# Altium footprint library 14-Inductors.PcbLib: 164 footprints (part 10 of 11)
Each footprint in its own frame and in the unit in brackets; x right, y up, seen from the top. Pads: shape width x height; smd on the part's side, far side on the other; paste and mask are expansions set on the pad; w line width, h text height; cw(c..) or ccw(c..) is an arc to the next point about the centre after c.
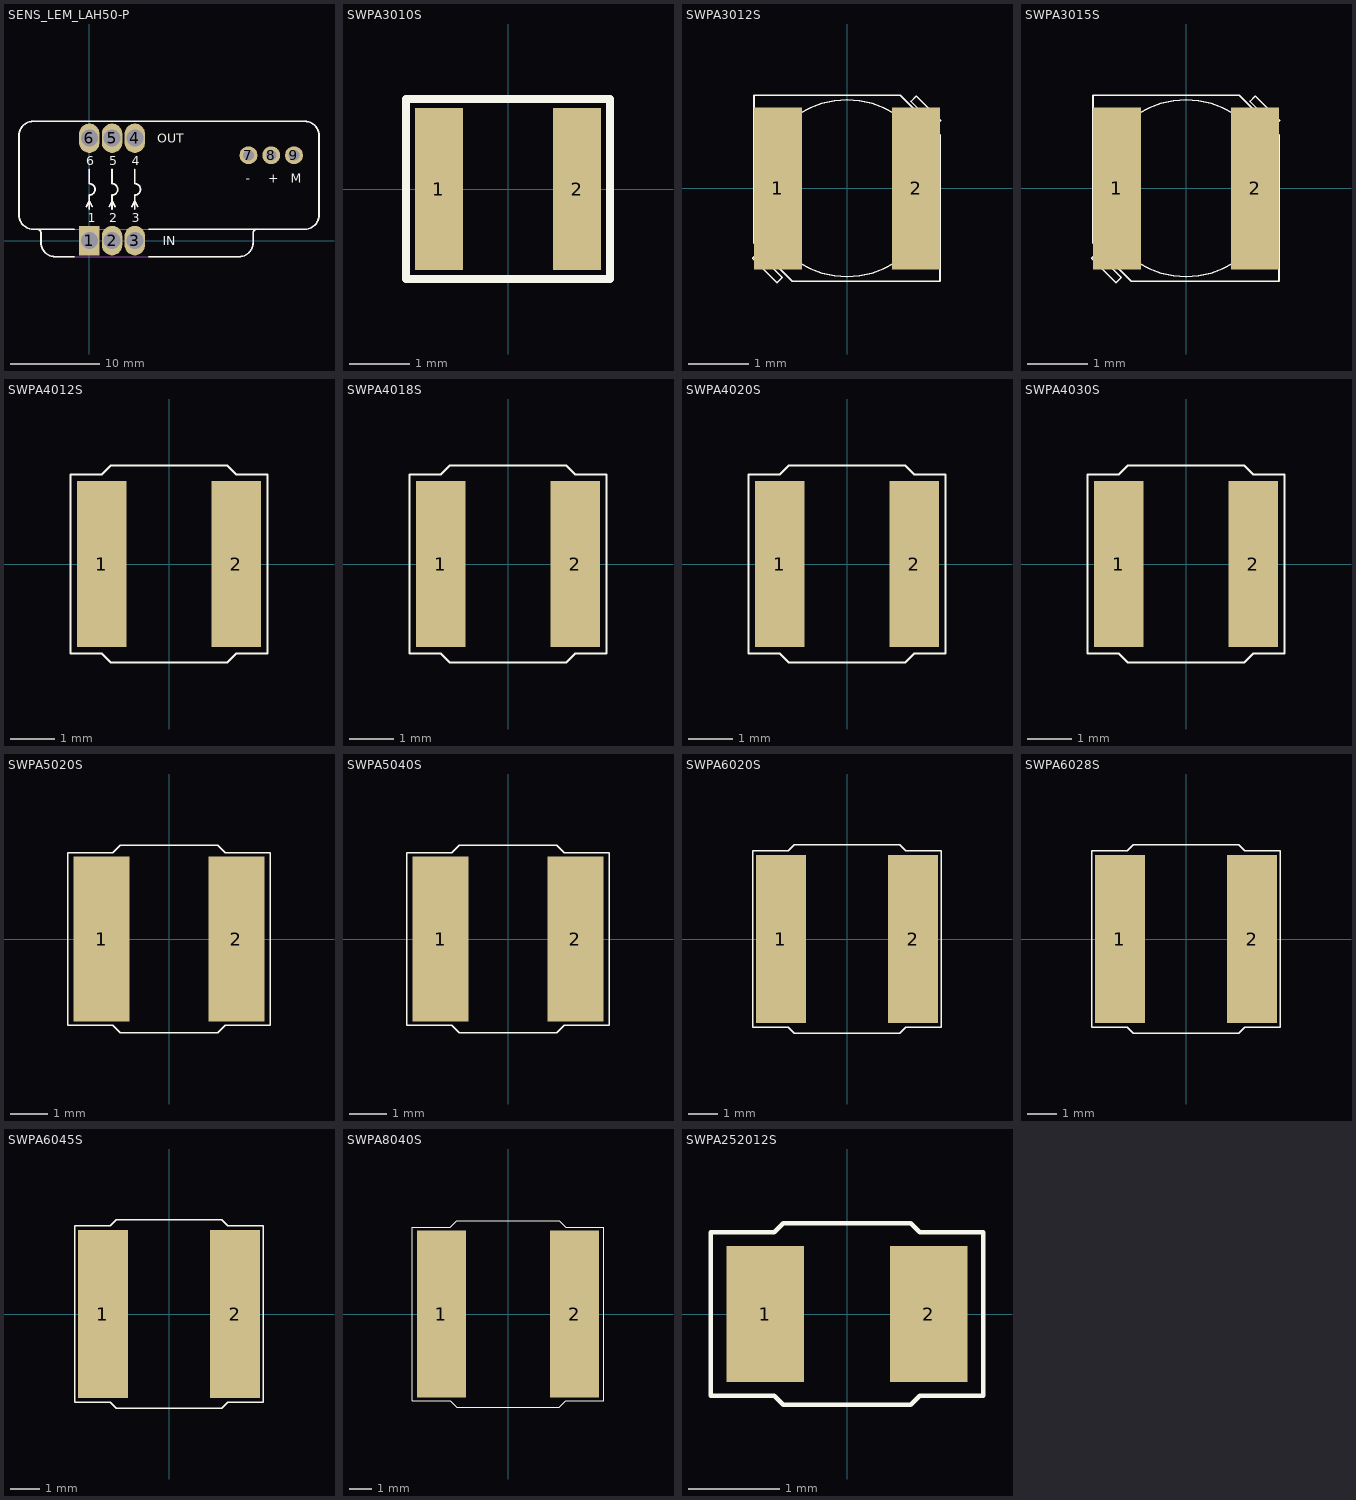
[diagram p9: the footprints below, top view; thin cyan lines are the x and y axes]

## PCBComponent_1 - duplicate [mm]

## SENS_LEM_LAH50-P [mm] "LEM Current Transducer, Body 33.5X15.13mm (max)"
height 21.2
pads (9):
  rect 2.28x3.3 hole 1.9: 1(0,0)
  oval 2.28x3.3 hole 1.9: 2(2.54,0) 3(5.08,0) 4(5.08,11.43) 5(2.54,11.43) 6(0,11.43)
  round 2 hole 1.2: 7(17.77,9.525) 8(20.31,9.525) 9(22.85,9.525)
Top Overlay:
  lines w0.2: -5.805,1.26 cw(c-5.805,0.86) -5.405,0.86 -5.405,-0.205 ccw(c-3.805,-0.205) -3.805,-1.805 -1.675,-1.805 ; -1.675,1.26 -6.255,1.26 cw(c-6.255,2.86) -7.855,2.86 -7.855,11.725 cw(c-6.255,11.725) -6.255,13.325 24.045,13.325 cw(c24.045,11.725) 25.645,11.725 25.645,2.86 cw(c24.045,2.86) 24.045,1.26 6.65,1.26 ; -0.318,3.81 0,4.445 0.318,3.81 ; 0,3.493 0,5.08 ccw(c0,5.715) 0,6.35 0,7.938 ; 2.222,3.81 2.54,4.445 2.857,3.81 ; 2.54,3.493 2.54,5.08 ccw(c2.54,5.715) 2.54,6.35 2.54,7.938 ; 4.763,3.81 5.08,4.445 5.398,3.81 ; 5.08,3.493 5.08,5.08 ccw(c5.08,5.715) 5.08,6.35 5.08,7.938 ; 6.65,-1.805 16.695,-1.805 ccw(c16.695,-0.205) 18.295,-0.205 18.295,0.86 cw(c18.695,0.86) 18.695,1.26
  text "IN" at 8.223,-0.5 h1.02
  text "OUT" at 7.557,10.93 h1.02
  text "3" at 4.747,2.04 h1.02
  text "4" at 4.747,8.39 h1.02
  text "2" at 2.207,2.04 h1.02
  text "5" at 2.207,8.39 h1.02
  text "1" at -0.167,2.04 h1.02
  text "6" at -0.333,8.39 h1.02
  text "+" at 19.987,6.485 h1.02
  text "-" at 17.447,6.485 h1.02
  text "M" at 22.517,6.485 h1.02
Mechanical 14:
  lines w0.1: -5.805,1.26 cw(c-5.805,0.86) -5.405,0.86 -5.405,-0.205 ccw(c-3.805,-0.205) -3.805,-1.805 16.695,-1.805 ccw(c16.695,-0.205) 18.295,-0.205 18.295,0.86 cw(c18.695,0.86) 18.695,1.26 ; -0.318,3.81 0,4.445 0.318,3.81 ; 0,3.493 0,5.08 ccw(c0,5.715) 0,6.35 0,7.938 ; 2.222,3.81 2.54,4.445 2.857,3.81 ; 2.54,3.493 2.54,5.08 ccw(c2.54,5.715) 2.54,6.35 2.54,7.938 ; 4.763,3.81 5.08,4.445 5.398,3.81 ; 5.08,3.493 5.08,5.08 ccw(c5.08,5.715) 5.08,6.35 5.08,7.938 ; -7.855,2.86 ccw(c-6.255,2.86) -6.255,1.26 24.045,1.26 ccw(c24.045,2.86) 25.645,2.86 25.645,11.725 ccw(c24.045,11.725) 24.045,13.325 -6.255,13.325 ccw(c-6.255,11.725) -7.855,11.725 -7.855,2.86
  text "IN" at 8.223,-0.5 h1.02
  text "OUT" at 7.557,10.93 h1.02
  text "3" at 4.747,2.04 h1.02
  text "4" at 4.747,8.39 h1.02
  text "2" at 2.207,2.04 h1.02
  text "5" at 2.207,8.39 h1.02
  text "1" at -0.167,2.04 h1.02
  text "6" at -0.333,8.39 h1.02
  text "+" at 19.987,6.485 h1.02
  text "-" at 17.447,6.485 h1.02
  text "M" at 22.517,6.485 h1.02
3D body "LAH50-P.stp": height 21, standoff -3.55, extent -7.755,-1.705 25.545,13.225

## SWPA3010S [mm]
height 3.1
pads (2):
  rect 0.8x2.7 smd mask+0.051: 1(-1.15,0) 2(1.15,0)
Top Overlay:
  lines w0.127: -1.7,-1.5 1.7,-1.5 1.7,1.5 -1.7,1.5 -1.7,-1.5
3D body "swpa3010s.stp": height 1, standoff -0.02, extent -1.5,-1.5 1.5,1.5

## SWPA3012S [mm]
height 3.1
pads (2):
  rect 0.8x2.7 smd mask+0.051: 1(-1.15,0) 2(1.15,0)
Top Overlay:
  circle w0.025: c0,0 r1.473
  lines w0.025: -1.575,-1.168 -1.168,-1.575 -1.079,-1.486 -1.486,-1.079 -1.575,-1.168 ; -1.55,-0.914 -0.914,-1.55 1.55,-1.55 1.55,0.888 0.888,1.55 -1.55,1.55 -1.55,-0.914 ; 1.067,1.448 1.156,1.537 1.562,1.13 1.473,1.041 1.067,1.448
3D body "swpa3012S.stp": height 1.2, standoff -0.02, extent -1.5,-1.5 1.5,1.5

## SWPA3015S [mm]
height 3.1
pads (2):
  rect 0.8x2.7 smd mask+0.051: 1(-1.15,0) 2(1.15,0)
Top Overlay:
  circle w0.025: c0,0 r1.473
  lines w0.025: -1.575,-1.168 -1.168,-1.575 -1.079,-1.486 -1.486,-1.079 -1.575,-1.168 ; -1.55,-0.914 -0.914,-1.55 1.55,-1.55 1.55,0.888 0.888,1.55 -1.55,1.55 -1.55,-0.914 ; 1.067,1.448 1.156,1.537 1.562,1.13 1.473,1.041 1.067,1.448
3D body "swpa3015s.stp": height 1.5, standoff -0.02, extent -1.5,-1.5 1.5,1.5

## SWPA4012S [mm]
height 3.1
pads (2):
  rect 1.1x3.7 smd mask+0.051: 1(-1.5,0) 2(1.5,0)
Top Overlay:
  lines w0.051: -2.2,-2 -1.5,-2 -1.3,-2.2 1.3,-2.2 1.5,-2 2.2,-2 2.2,2 1.5,2 1.3,2.2 -1.3,2.2 -1.5,2 -2.2,2 -2.2,-2
3D body "swpa4012s.stp": height 1.2, standoff -0.02, extent -2,-2 2,2

## SWPA4018S [mm]
height 3.1
pads (2):
  rect 1.1x3.7 smd mask+0.051: 1(-1.5,0) 2(1.5,0)
Top Overlay:
  lines w0.051: -2.2,-2 -2.2,2 -1.5,2 -1.3,2.2 1.3,2.2 1.5,2 2.2,2 2.2,-2 1.5,-2 1.3,-2.2 -1.3,-2.2 -1.5,-2 -2.2,-2
3D body "swpa4018s.stp": height 1.8, standoff -0.02, extent -2,-2 2,2

## SWPA4020S [mm]
height 3.1
pads (2):
  rect 1.1x3.7 smd mask+0.051: 1(-1.5,0) 2(1.5,0)
Top Overlay:
  lines w0.051: -2.2,-2 -2.2,2 -1.5,2 -1.3,2.2 1.3,2.2 1.5,2 2.2,2 2.2,-2 1.5,-2 1.3,-2.2 -1.3,-2.2 -1.5,-2 -2.2,-2
3D body "swpa4020s.stp": height 2, standoff -0.02, extent -2,-2 2,2

## SWPA4030S [mm]
height 3.1
pads (2):
  rect 1.1x3.7 smd mask+0.051: 1(-1.5,0) 2(1.5,0)
Top Overlay:
  lines w0.051: -2.2,-2 -1.5,-2 -1.3,-2.2 1.3,-2.2 1.5,-2 2.2,-2 2.2,2 1.5,2 1.3,2.2 -1.3,2.2 -1.5,2 -2.2,2 -2.2,-2
3D body "swpa4030s.stp": height 3, standoff -0.02, extent -2,-2 2,2

## SWPA5020S [mm]
height 3.1
pads (2):
  rect 1.5x4.4 smd mask+0.051: 1(-1.8,0) 2(1.8,0)
Top Overlay:
  lines w0.051: -2.7,-2.3 -2.7,2.3 -1.5,2.3 -1.3,2.5 1.3,2.5 1.5,2.3 2.7,2.3 2.7,-2.3 1.5,-2.3 1.3,-2.5 -1.3,-2.5 -1.5,-2.3 -2.7,-2.3
3D body "swpa5020s.stp": height 2, standoff -0.02, extent -2.5,-2.5 2.5,2.5

## SWPA5040S [mm]
height 3.1
pads (2):
  rect 1.5x4.4 smd mask+0.051: 1(-1.8,0) 2(1.8,0)
Top Overlay:
  lines w0.051: -2.7,-2.3 -1.5,-2.3 -1.3,-2.5 1.3,-2.5 1.5,-2.3 2.7,-2.3 2.7,2.3 1.5,2.3 1.3,2.5 -1.3,2.5 -1.5,2.3 -2.7,2.3 -2.7,-2.3
3D body "swpa5040s.stp": height 4, standoff -0.02, extent -2.5,-2.5 2.5,2.5

## SWPA6020S [mm]
height 3.1
pads (2):
  rect 1.7x5.7 smd mask+0.051: 1(-2.25,0) 2(2.25,0)
Top Overlay:
  lines w0.051: -3.2,-3 -2,-3 -1.8,-3.2 1.8,-3.2 2,-3 3.2,-3 3.2,3 2,3 1.8,3.2 -1.8,3.2 -2,3 -3.2,3 -3.2,-3
3D body "swpa6020s.stp": height 2, standoff -0.03, extent -3,-2.975 3,2.975

## SWPA6028S [mm]
height 3.1
pads (2):
  rect 1.7x5.7 smd mask+0.051: 1(-2.25,0) 2(2.25,0)
Top Overlay:
  lines w0.051: -3.2,-3 -3.2,3 -2,3 -1.8,3.2 1.8,3.2 2,3 3.2,3 3.2,-3 2,-3 1.8,-3.2 -1.8,-3.2 -2,-3 -3.2,-3
3D body "swpa6028s.stp": height 2.8, standoff -0.03, extent -2.95,-3 3,3

## SWPA6045S [mm]
height 3.1
pads (2):
  rect 1.7x5.7 smd mask+0.051: 1(-2.25,0) 2(2.25,0)
Top Overlay:
  lines w0.051: -3.2,-3 -2,-3 -1.8,-3.2 1.8,-3.2 2,-3 3.2,-3 3.2,3 2,3 1.8,3.2 -1.8,3.2 -2,3 -3.2,3 -3.2,-3
3D body "swpa6045s.stp": height 4.5, standoff -0.03, extent -3,-3 3,2.95

## SWPA8040S [mm]
height 3.1
pads (2):
  rect 2.2x7.5 smd mask+0.051: 1(-3,0) 2(3,0)
Top Overlay:
  lines w0.051: -4.3,-3.9 -4.3,3.9 -2.6,3.9 -2.3,4.2 2.3,4.2 2.6,3.9 4.3,3.9 4.3,-3.9 2.6,-3.9 2.3,-4.2 -2.3,-4.2 -2.6,-3.9 -4.3,-3.9
3D body "swpa8040s.stp": height 4, standoff -0.04, extent -4,-4 4,4

## SWPA252012S [mm]
height 3.1
pads (2):
  rect 0.85x1.5 smd mask+0.051: 1(-0.9,0) 2(0.9,0)
Top Overlay:
  lines w0.051: -1.5,-0.9 -0.8,-0.9 -0.7,-1 0.7,-1 0.8,-0.9 1.5,-0.9 1.5,0.9 0.8,0.9 0.7,1 -0.4,1 -0.7,1 -0.8,0.9 -1.5,0.9 -1.5,-0.9
3D body "swpa252012s.stp": height 1.2, standoff -0.02, extent -1.25,-1 1.25,1